# Altium footprint library ACTION_IC.PcbLib: 137 footprints (part 3 of 9)
Each footprint in its own frame and in the unit in brackets; x right, y up, seen from the top. Pads: shape width x height; smd on the part's side, far side on the other; paste and mask are expansions set on the pad; w line width, h text height; cw(c..) or ccw(c..) is an arc to the next point about the centre after c.
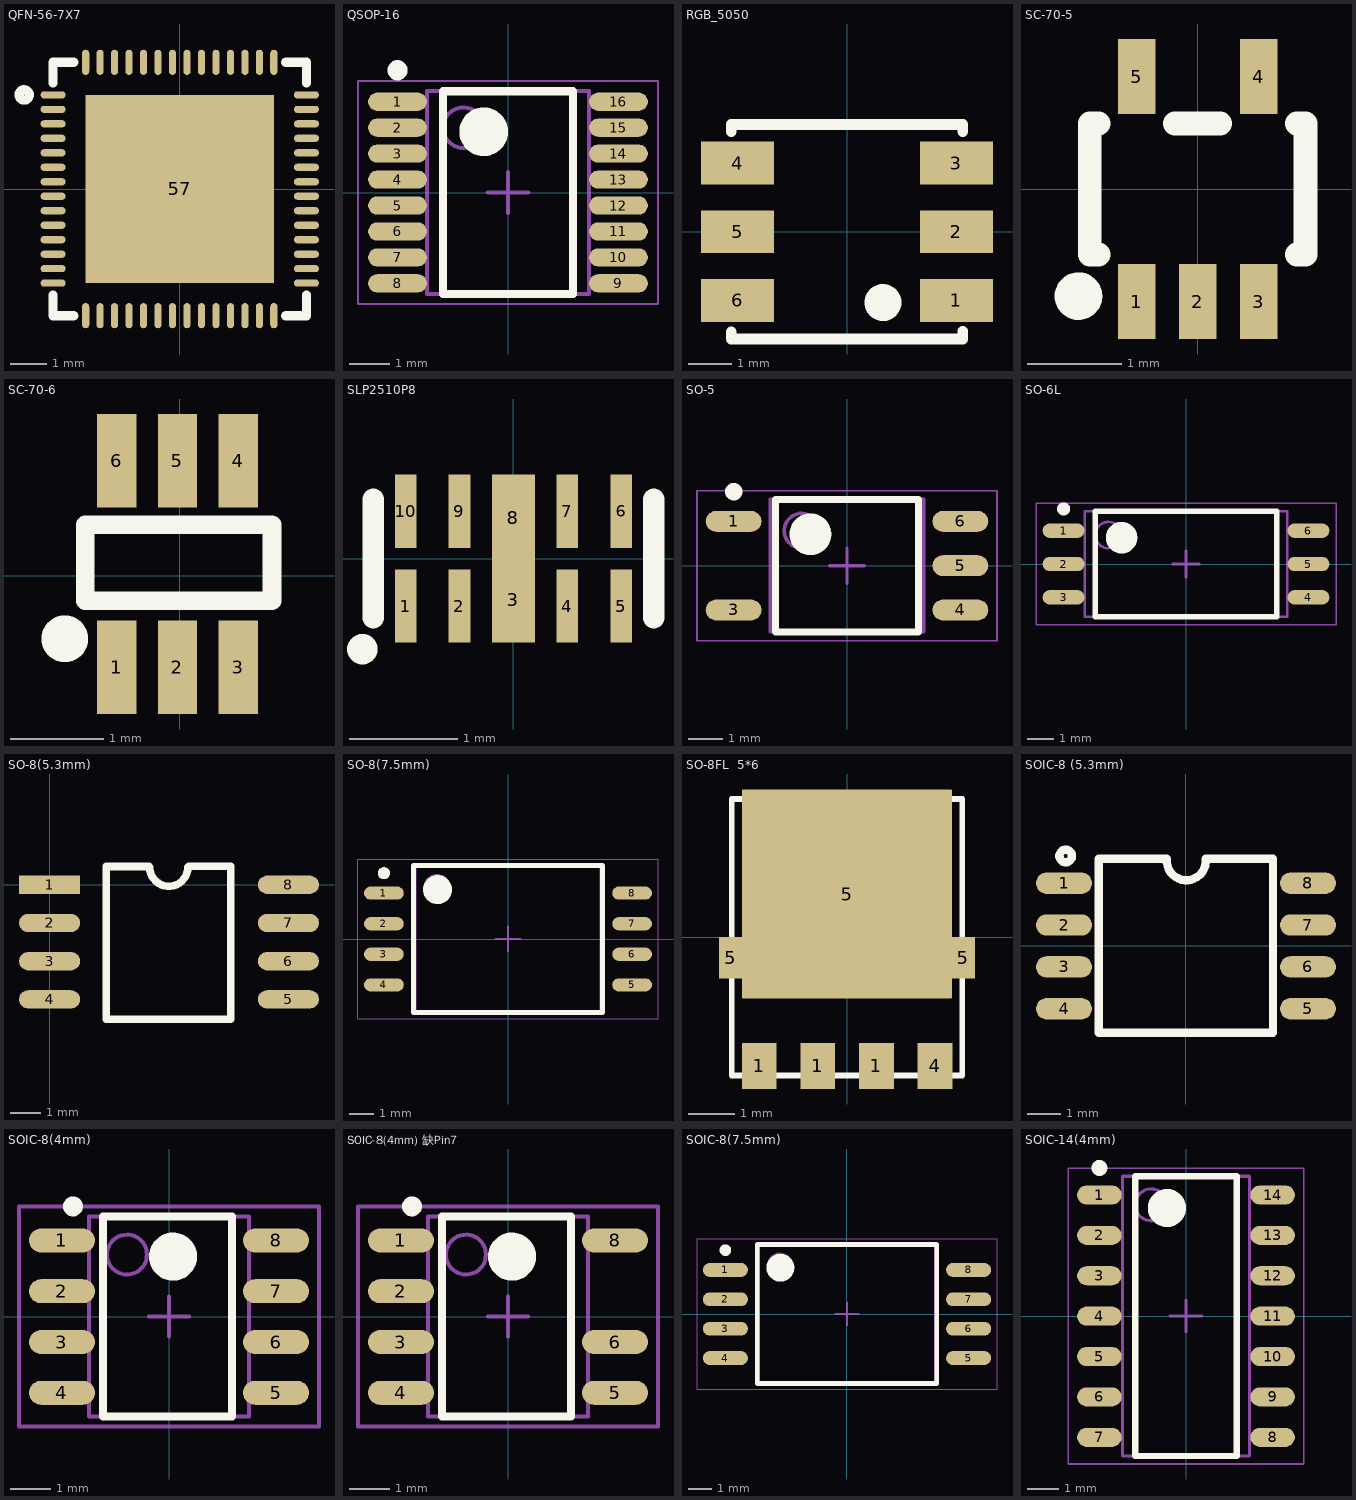
[diagram p2: the footprints below, top view; thin cyan lines are the x and y axes]

## QFN-56-7X7 [mm]
pads (57):
  oval 0.695x0.2 smd: 1(-3.5,2.6) 2(-3.5,2.2) 3(-3.5,1.8) 4(-3.5,1.4) 5(-3.5,1) 6(-3.5,0.6) 7(-3.5,0.2) 8(-3.5,-0.2) 9(-3.5,-0.6) 10(-3.5,-1) 11(-3.5,-1.4) 12(-3.5,-1.8) 13(-3.5,-2.2) 14(-3.5,-2.6) 29(3.5,-2.6) 30(3.5,-2.2) 31(3.5,-1.8) 32(3.5,-1.4) 33(3.5,-1) 34(3.5,-0.6) 35(3.5,-0.2) 36(3.5,0.2) 37(3.5,0.6) 38(3.5,1) 39(3.5,1.4) 40(3.5,1.8) 41(3.5,2.2) 42(3.5,2.6)
  oval 0.2x0.695 smd: 15(-2.6,-3.5) 16(-2.2,-3.5) 17(-1.8,-3.5) 18(-1.4,-3.5) 19(-1,-3.5) 20(-0.6,-3.5) 21(-0.2,-3.5) 22(0.2,-3.5) 23(0.6,-3.5) 24(1,-3.5) 25(1.4,-3.5) 26(1.8,-3.5) 27(2.2,-3.5) 28(2.6,-3.5) 43(2.6,3.5) 44(2.2,3.5) 45(1.8,3.5) 46(1.4,3.5) 47(1,3.5) 48(0.6,3.5) 49(0.2,3.5) 50(-0.2,3.5) 51(-0.6,3.5) 52(-1,3.5) 53(-1.4,3.5) 54(-1.8,3.5) 55(-2.2,3.5) 56(-2.6,3.5)
  rect 5.2x5.2 smd: 57(0,0)
Top Overlay:
  circle w0.254: c-4.3,2.6 r0.141
  lines w0.254: -3.5,-2.931 -3.5,-3.5 -2.931,-3.5 ; -3.5,2.931 -3.5,3.5 -2.931,3.5 ; 2.931,-3.5 3.5,-3.5 3.5,-2.931 ; 2.931,3.5 3.5,3.5 3.5,2.931
Mechanical 15:
  lines w0.003: 0.173,0.025 0.223,-0.025
3D body "User Library-QFN56_0_4.step": height 0.8, standoff 0, extent -3.5,-3.5 3.5,3.5

## QSOP-16 [mm]
height 1.75
pads (16):
  oval 1.45x0.45 smd: 1(-2.725,2.24) 2(-2.725,1.6) 3(-2.725,0.96) 4(-2.725,0.32) 5(-2.725,-0.32) 6(-2.725,-0.96) 7(-2.725,-1.6) 8(-2.725,-2.24) 9(2.725,-2.24) 10(2.725,-1.6) 11(2.725,-0.96) 12(2.725,-0.32) 13(2.725,0.32) 14(2.725,0.96) 15(2.725,1.6) 16(2.725,2.24)
Top Overlay:
  circle w0.6: c-0.6,1.5 r0.3
  circle w0.25: c-2.725,3.015 r0.125
  lines w0.2: -1.6,-2.5 1.6,-2.5 1.6,2.5 -1.6,2.5 -1.6,-2.5
Mechanical 13:
  circle w0.1: c-1.1,1.6 r0.5
  lines w0.1: -2,-2.5 2,-2.5 2,2.5 -2,2.5 -2,-2.5
Mechanical 15:
  lines w0.05: -3.7,-2.75 3.7,-2.75 3.7,2.75 -3.7,2.75 -3.7,-2.75
  lines w0.1: -0.5,0 0.5,0 ; 0,-0.5 0,0.5
3D body: height 1.75, standoff 0.1, extent -2,-2.5 2,2.5

## RGB_5050 [mm]
pads (6):
  rect 1.7x1 smd: 1(2.55,-1.6) 2(2.55,0) 3(2.55,1.6) 4(-2.55,1.6) 5(-2.55,0) 6(-2.55,-1.6)
Top Overlay:
  circle w0.5: c0.838,-1.651 r0.18
  lines w0.254: -2.7,-2.337 -2.7,-2.5 2.7,-2.5 2.7,-2.319 ; -2.7,2.337 -2.7,2.5 2.7,2.5 2.7,2.337
3D body "User Library-5050 RGB led.STEP": height 1.6, standoff 0, extent -2.77,-2.55 2.77,2.55

## SC-70-5 [mm]
pads (5):
  rect 0.4x0.8 smd: 1(-0.65,-1.2) 2(0,-1.2) 3(0.65,-1.2) 4(0.65,1.2) 5(-0.65,1.2)
Top Overlay:
  circle w0.254: c-1.27,-1.143 r0.127
  lines w0.254: -1.058,-0.7 -1.15,-0.7 -1.15,0.7 -1.058,0.7 ; -0.242,0.7 0.242,0.7 ; 1.058,-0.7 1.15,-0.7 1.15,0.7 1.058,0.7
3D body "User Library-SC70-5-MAX.STEP": height 1.09, standoff -0.01, extent -1.05,-1.2 1.15,1.2

## SC-70-6 [mil]
pads (6):
  rect 16.54x39.37 smd: 1(-26.59,-38.5) 2(-1,-38.5) 3(24.59,-38.5) 4(24.59,48.5) 5(-1,48.5) 6(-26.59,48.5)
Top Overlay:
  lines w7.87: -39.87,-10.49 38.87,-10.49 38.87,21.51 -39.87,21.51 -39.87,13.38 -39.87,-10.49
  lines w9.84: -43.5,-26.59 cw(c-48.42,-26.54) -43.5,-26.49

## SLP2510P8 [mm]
pads (10):
  rect 0.2x0.68 smd: 1(-1,-0.44) 2(-0.5,-0.44) 4(0.5,-0.44) 5(1,-0.44) 6(1,0.44) 7(0.5,0.44) 9(-0.5,0.44) 10(-1,0.44)
  rect 0.4x0.8 smd: 3(0,-0.38) 8(0,0.38)
Top Overlay:
  circle w0.2: c-1.4,-0.84 r0.041
  lines w0.2: -1.3,-0.55 -1.3,0.55 ; 1.3,-0.55 1.3,0.55
Mechanical 15:
  lines w0.003: -0.046,0.456 0.005,0.507

## SO-5 [mm]
height 4
pads (5):
  oval 1.6x0.6 smd: 1(-3.25,1.27) 3(-3.25,-1.27) 4(3.25,-1.27) 5(3.25,0) 6(3.25,1.27)
Top Overlay:
  circle w0.25: c-3.25,2.12 r0.125
  circle w0.6: c-1.05,0.9 r0.3
  lines w0.2: -2.05,-1.9 -2.05,1.9 2.05,1.9 2.05,-1.9 -2.05,-1.9
Mechanical 13:
  circle w0.1: c-1.3,1 r0.5
  lines w0.1: -2.2,-1.9 -2.2,1.9 2.2,1.9 2.2,-1.9 -2.2,-1.9
Mechanical 15:
  lines w0.05: -4.3,-2.15 -4.3,2.15 4.3,2.15 4.3,-2.15 -4.3,-2.15
  lines w0.1: -0.5,0 0.5,0 ; 0,-0.5 0,0.5
3D body: height 2.5, standoff 0.1, extent -2.2,-1.9 2.2,1.9

## SO-6L [mm]
height 2.2
pads (6):
  oval 1.6x0.55 smd: 1(-4.65,1.27) 2(-4.65,0) 3(-4.65,-1.27) 4(4.65,-1.27) 5(4.65,0) 6(4.65,1.27)
Top Overlay:
  circle w0.25: c-4.65,2.095 r0.125
  circle w0.6: c-2.45,1 r0.3
  lines w0.2: -3.45,-2 -3.45,2 3.45,2 3.45,-2 -3.45,-2
Mechanical 13:
  circle w0.1: c-2.95,1.1 r0.5
  lines w0.1: -3.85,-2 -3.85,2 3.85,2 3.85,-2 -3.85,-2
Mechanical 15:
  lines w0.05: -5.7,-2.3 -5.7,2.3 5.7,2.3 5.7,-2.3 -5.7,-2.3
  lines w0.1: -0.5,0 0.5,0 ; 0,-0.5 0,0.5
3D body "SO-6L.step": height 2.2, standoff 0, extent -5,-2 5,2

## SO-8(5.3mm) [mil]
pads (8):
  rect 80x24 smd: 1(0,0)
  oval 80x24 smd: 2(0,-50) 3(0,-100) 4(0,-150) 5(312.6,-150) 6(312.6,-100) 7(312.6,-50) 8(312.6,0)
Top Overlay:
  lines w10: 130.06,23.94 74.39,23.94 74.39,-176.06 237.01,-176.06 ; 131,23 ccw(c156,23) 181,23 ; 182,24 237.01,24 ; 236.01,23 237.01,24 ; 237.01,-176 237.01,24
3D body "User Library-SO-8W.STEP": height 76.77, standoff 0, extent 1.5,-179.33 312.52,29.33

## SO-8(7.5mm) [mm]
height 2.2
pads (8):
  oval 1.65x0.55 smd: 1(-5.15,1.905) 2(-5.15,0.635) 3(-5.15,-0.635) 4(-5.15,-1.905) 5(5.15,-1.905) 6(5.15,-0.635) 7(5.15,0.635) 8(5.15,1.905)
Top Overlay:
  circle w0.25: c-5.15,2.73 r0.125
  circle w0.6: c-2.925,2.05 r0.3
  lines w0.2: -3.925,-3.05 -3.925,3.05 3.925,3.05 3.925,-3.05 -3.925,-3.05
Mechanical 13:
  circle w0.1: c-2.95,2.15 r0.5
  lines w0.1: -3.85,-3.05 -3.85,3.05 3.85,3.05 3.85,-3.05 -3.85,-3.05
Mechanical 15:
  lines w0.05: -6.225,-3.3 -6.225,3.3 6.225,3.3 6.225,-3.3 -6.225,-3.3
  lines w0.1: -0.5,0 0.5,0 ; 0,-0.5 0,0.5
3D body: height 2.2, standoff 0.1, extent -3.85,-3.05 3.85,3.05

## SO-8FL  5*6 [mm]
pads (7):
  rect 0.75x1 smd: 1(-1.9,-2.795) 1(-0.63,-2.795) 1(0.64,-2.795) 4(1.91,-2.795)
  rrect1% 0.52x0.905 smd: 5(-2.52,-0.45) 5(2.52,-0.45)
  rrect1% 4.56x4.53 smd: 5(0,0.935)
Top Overlay:
  lines w0.127: -2.5,-3 -2.5,3 2.5,3 2.5,-3 -2.5,-3
3D body: height 0.25, standoff 0, extent -2.5,-3 2.5,3

## SOIC-8 (5.3mm) [mm]
pads (8):
  oval 1.7x0.65 smd: 1(-3.7,1.905) 2(-3.7,0.635) 3(-3.7,-0.635) 4(-3.7,-1.905) 5(3.7,-1.905) 6(3.7,-0.635) 7(3.7,0.635) 8(3.7,1.905)
Top Overlay:
  circle w0.254: c-3.65,2.73 r0.191
  lines w0.254: -0.58,2.63 ccw(c0.01,2.585) 0.6,2.63 ; -0.58,2.64 -2,2.64 -2.65,2.64 -2.65,-2.63 2.64,-2.63 2.64,2.64 2,2.64 0.6,2.64
3D body "User Library-SO-8W.STEP": height 1.95, standoff 0, extent -3.924,-2.65 3.975,2.65

## SOIC-8(4mm) [mm] "SOIC, 8-Leads, Body 5.0x4.0mm (max), Pitch 1.27mm, IPC Medium Density"
height 1.75
pads (8):
  oval 1.65x0.6 smd: 1(-2.675,1.905) 2(-2.675,0.635) 3(-2.675,-0.635) 4(-2.675,-1.905) 5(2.675,-1.905) 6(2.675,-0.635) 7(2.675,0.635) 8(2.675,1.905)
Top Overlay:
  circle w0.6: c0.1,1.5 r0.3
  circle w0.25: c-2.4,2.755 r0.125
  lines w0.2: -1.651,-2.5 1.575,-2.5 1.575,2.5 -1.651,2.5 -1.651,-2.5
Mechanical 13:
  circle w0.1: c-1.05,1.55 r0.5
  lines w0.1: -2,-2.5 2,-2.5 2,2.5 -2,2.5 -2,-2.5
Mechanical 15:
  lines w0.1: -0.5,0 0.5,0 ; 0,-0.5 0,0.5 ; -3.75,-2.75 3.75,-2.75 3.75,2.75 -3.75,2.75 -3.75,-2.75
3D body "SOIC8.STEP": height 1.6, standoff 0, extent -2.995,-2.535 3.046,2.485

## SOIC-8(4mm) 缺Pin7 [mm] "SOIC, 8-Leads, Body 5.0x4.0mm (max), Pitch 1.27mm, IPC Medium Density"
height 1.75
pads (7):
  oval 1.65x0.6 smd: 1(-2.675,1.905) 2(-2.675,0.635) 3(-2.675,-0.635) 4(-2.675,-1.905) 5(2.675,-1.905) 6(2.675,-0.635) 8(2.675,1.905)
Top Overlay:
  circle w0.6: c0.1,1.5 r0.3
  circle w0.25: c-2.4,2.755 r0.125
  lines w0.2: -1.651,-2.5 1.575,-2.5 1.575,2.5 -1.651,2.5 -1.651,-2.5
Mechanical 13:
  circle w0.1: c-1.05,1.55 r0.5
  lines w0.1: -2,-2.5 2,-2.5 2,2.5 -2,2.5 -2,-2.5
Mechanical 15:
  lines w0.1: -0.5,0 0.5,0 ; 0,-0.5 0,0.5 ; -3.75,-2.75 3.75,-2.75 3.75,2.75 -3.75,2.75 -3.75,-2.75
3D body "SOIC8.STEP": height 1.6, standoff 0, extent -2.995,-2.535 3.046,2.485

## SOIC-8(7.5mm) [mm]
height 2.3
pads (8):
  oval 1.95x0.6 smd: 1(-5.25,1.905) 2(-5.25,0.635) 3(-5.25,-0.635) 4(-5.25,-1.905) 5(5.25,-1.905) 6(5.25,-0.635) 7(5.25,0.635) 8(5.25,1.905)
Top Overlay:
  circle w0.6: c-2.875,2 r0.3
  circle w0.25: c-5.25,2.755 r0.125
  lines w0.2: -3.875,-3 3.875,-3 3.875,3 -3.875,3 -3.875,-3
Mechanical 13:
  circle w0.1: c-2.9,2.1 r0.5
  lines w0.1: -3.8,-3 3.8,-3 3.8,3 -3.8,3 -3.8,-3
Mechanical 15:
  lines w0.05: -6.475,-3.25 6.475,-3.25 6.475,3.25 -6.475,3.25 -6.475,-3.25
  lines w0.1: -0.5,0 0.5,0 ; 0,-0.5 0,0.5
3D body "SOIC-8(7.5mm).step": height 2.3, standoff 0, extent -5.75,-3 5.75,3

## SOIC-14(4mm) [mm]
height 1.75
pads (14):
  oval 1.4x0.6 smd: 1(-2.725,3.81) 2(-2.725,2.54) 3(-2.725,1.27) 4(-2.725,0) 5(-2.725,-1.27) 6(-2.725,-2.54) 7(-2.725,-3.81) 8(2.725,-3.81) 9(2.725,-2.54) 10(2.725,-1.27) 11(2.725,0) 12(2.725,1.27) 13(2.725,2.54) 14(2.725,3.81)
Top Overlay:
  circle w0.25: c-2.725,4.66 r0.125
  circle w0.6: c-0.6,3.4 r0.3
  lines w0.2: -1.6,-4.4 -1.6,4.4 1.6,4.4 1.6,-4.4 -1.6,-4.4
Mechanical 13:
  circle w0.1: c-1.1,3.5 r0.5
  lines w0.1: -2,-4.4 -2,4.4 2,4.4 2,-4.4 -2,-4.4
Mechanical 15:
  lines w0.05: -3.7,-4.65 -3.7,4.65 3.7,4.65 3.7,-4.65 -3.7,-4.65
  lines w0.1: -0.5,0 0.5,0 ; 0,-0.5 0,0.5
3D body "SOIC-14.step": height 1.75, standoff 0, extent -3,-4.4 3,4.4